# Altium footprint library WR-TBL_Pluggable PCB Header.PcbLib: 719 footprints (part 25 of 45)
Each footprint in its own frame and in the unit in brackets; x right, y up, seen from the top. Pads: shape width x height; smd on the part's side, far side on the other; paste and mask are expansions set on the pad; w line width, h text height; cw(c..) or ccw(c..) is an arc to the next point about the centre after c.
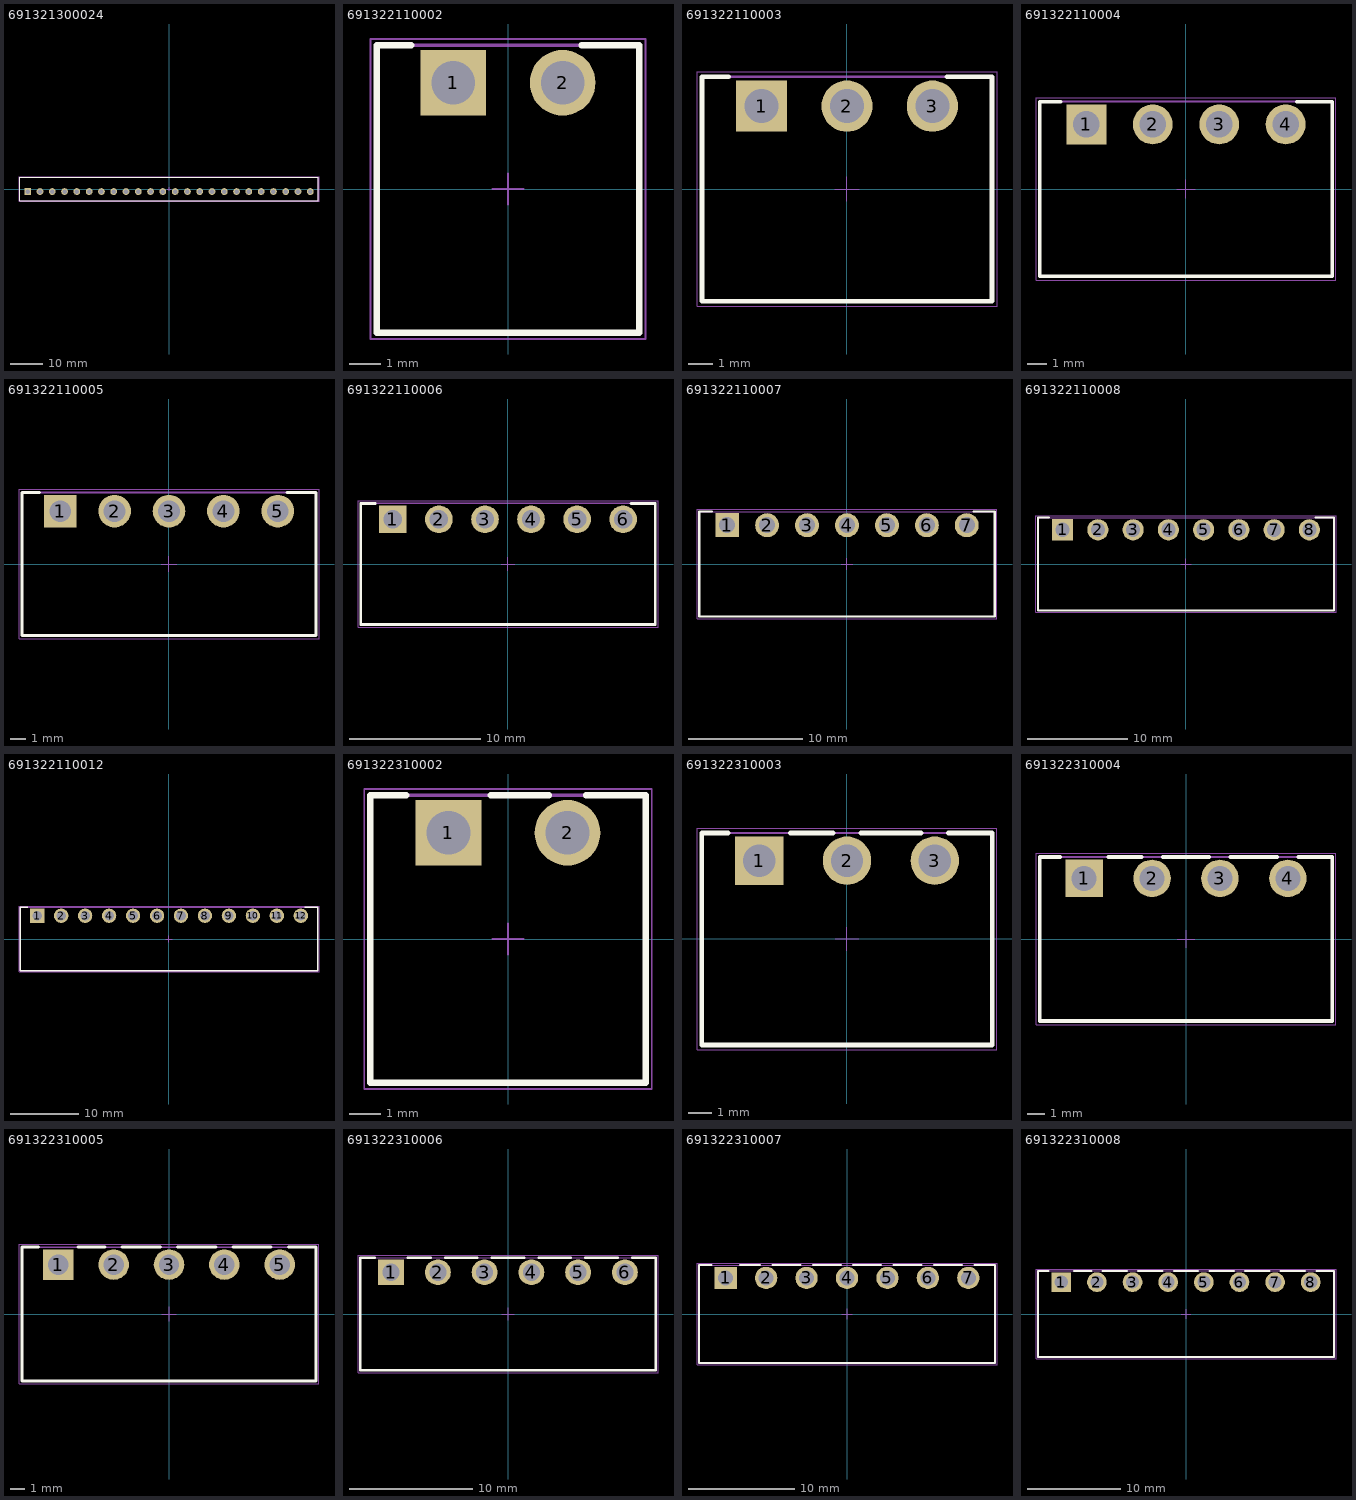
[diagram p24: the footprints below, top view; thin cyan lines are the x and y axes]

## 691321300024 [mm] "Vertical PCB Header, pitch 3.81mm, 24p"
height 9.2
pads (24):
  rect 2.1x2.1 hole 1.4: 1(-43.815,-0.8)
  round 2.1 hole 1.4: 2(-40.005,-0.8) 3(-36.195,-0.8) 4(-32.385,-0.8) 5(-28.575,-0.8) 6(-24.765,-0.8) 7(-20.955,-0.8) 8(-17.145,-0.8) 9(-13.335,-0.8) 10(-9.525,-0.8) 11(-5.715,-0.8) 12(-1.905,-0.8) 13(1.905,-0.8) 14(5.715,-0.8) 15(9.525,-0.8) 16(13.335,-0.8) 17(17.145,-0.8) 18(20.955,-0.8) 19(24.765,-0.8) 20(28.575,-0.8) 21(32.385,-0.8) 22(36.195,-0.8) 23(40.005,-0.8) 24(43.815,-0.8)
Top Overlay:
  lines w0.2: -46.315,-3.6 -46.315,3.6 46.315,3.6 46.315,-3.6 -46.315,-3.6
Mechanical 13:
  lines w0.1: -46.315,-3.6 46.315,-3.6 46.315,3.6 -46.315,3.6 -46.315,-3.6
Mechanical 15:
  lines w0.05: -0.5,0 0.5,0 ; 0,-0.5 0,0.5 ; -46.515,-3.8 46.515,-3.8 46.515,3.8 -46.515,3.8 -46.515,-3.8
3D body "691321300024.stp": height 9.25, standoff -3.45, extent -46.315,-3.6 46.315,3.6

## 691322110002 [mm] "Horizontal PCB Header, pitch 3.5mm, 02p"
height 7
pads (2):
  rect 2.1x2.1 hole 1.4: 1(-1.75,3.4)
  round 2.1 hole 1.4: 2(1.75,3.4)
Top Overlay:
  lines w0.2: -3.1,4.6 -4.2,4.6 -4.2,-4.6 4.2,-4.6 4.2,4.6 2.35,4.6
Mechanical 13:
  lines w0.1: -4.2,-4.6 4.2,-4.6 4.2,4.6 -4.2,4.6 -4.2,-4.6
Mechanical 15:
  lines w0.05: -0.5,0 0.5,0 ; 0,-0.5 0,0.5 ; -4.4,-4.8 4.4,-4.8 4.4,4.8 -4.4,4.8 -4.4,-4.8
3D body "691322110002.stp": height 7.3, standoff -3.4, extent -4.2,-4.6 4.2,4.6

## 691322110003 [mm] "Horizontal PCB Header, pitch 3.5mm, 03p"
height 7
pads (3):
  rect 2.1x2.1 hole 1.4: 1(-3.5,3.4)
  round 2.1 hole 1.4: 2(0,3.4) 3(3.5,3.4)
Top Overlay:
  lines w0.2: -4.85,4.6 -5.95,4.6 -5.95,-4.6 5.95,-4.6 5.95,4.6 4.1,4.6
Mechanical 13:
  lines w0.1: -5.95,-4.6 5.95,-4.6 5.95,4.6 -5.95,4.6 -5.95,-4.6
Mechanical 15:
  lines w0.05: -0.5,0 0.5,0 ; 0,-0.5 0,0.5 ; -6.15,-4.8 6.15,-4.8 6.15,4.8 -6.15,4.8 -6.15,-4.8
3D body "691322110003.stp": height 7.3, standoff -3.4, extent -5.95,-4.6 5.95,4.6

## 691322110004 [mm] "Horizontal PCB Header, pitch 3.5mm, 04p"
height 7
pads (4):
  rect 2.1x2.1 hole 1.4: 1(-5.25,3.4)
  round 2.1 hole 1.4: 2(-1.75,3.4) 3(1.75,3.4) 4(5.25,3.4)
Top Overlay:
  lines w0.2: -6.6,4.6 -7.7,4.6 -7.7,-4.6 7.7,-4.6 7.7,4.6 5.85,4.6
Mechanical 13:
  lines w0.1: -7.7,-4.6 -7.7,4.6 7.7,4.6 7.7,-4.6 -7.7,-4.6
Mechanical 15:
  lines w0.05: -0.5,0 0.5,0 ; 0,-0.5 0,0.5 ; -7.9,-4.8 -7.9,4.8 7.9,4.8 7.9,-4.8 -7.9,-4.8
3D body "691322110004.stp": height 7.3, standoff -3.4, extent -7.7,-4.6 7.7,4.6

## 691322110005 [mm] "Horizontal PCB Header, pitch 3.5mm, 05p"
height 7
pads (5):
  rect 2.1x2.1 hole 1.4: 1(-7,3.4)
  round 2.1 hole 1.4: 2(-3.5,3.4) 3(0,3.4) 4(3.5,3.4) 5(7,3.4)
Top Overlay:
  lines w0.2: -8.35,4.6 -9.45,4.6 -9.45,-4.6 9.45,-4.6 9.45,4.6 7.6,4.6
Mechanical 13:
  lines w0.1: -9.45,-4.6 -9.45,4.6 9.45,4.6 9.45,-4.6 -9.45,-4.6
Mechanical 15:
  lines w0.05: -0.5,0 0.5,0 ; 0,-0.5 0,0.5 ; -9.65,-4.8 -9.65,4.8 9.65,4.8 9.65,-4.8 -9.65,-4.8
3D body "691322110005.stp": height 7.3, standoff -3.4, extent -9.45,-4.6 9.45,4.6

## 691322110006 [mm] "Horizontal PCB Header, pitch 3.5mm, 06p"
height 7
pads (6):
  rect 2.1x2.1 hole 1.4: 1(-8.75,3.4)
  round 2.1 hole 1.4: 2(-5.25,3.4) 3(-1.75,3.4) 4(1.75,3.4) 5(5.25,3.4) 6(8.75,3.4)
Top Overlay:
  lines w0.2: -10.1,4.6 -11.2,4.6 -11.2,-4.6 11.2,-4.6 11.2,4.6 9.35,4.6
Mechanical 13:
  lines w0.1: -11.2,-4.6 -11.2,4.6 11.2,4.6 11.2,-4.6 -11.2,-4.6
Mechanical 15:
  lines w0.05: -0.5,0 0.5,0 ; 0,-0.5 0,0.5 ; -11.4,-4.8 -11.4,4.8 11.4,4.8 11.4,-4.8 -11.4,-4.8
3D body "691322110006.stp": height 7.3, standoff -3.4, extent -11.2,-4.6 11.2,4.6

## 691322110007 [mm] "Horizontal PCB Header, pitch 3.5mm, 07p"
height 7
pads (7):
  rect 2.1x2.1 hole 1.4: 1(-10.5,3.4)
  round 2.1 hole 1.4: 2(-7,3.4) 3(-3.5,3.4) 4(0,3.4) 5(3.5,3.4) 6(7,3.4) 7(10.5,3.4)
Top Overlay:
  lines w0.2: -11.85,4.6 -12.95,4.6 -12.95,-4.6 12.95,-4.6 12.95,4.6 11.1,4.6
Mechanical 13:
  lines w0.1: -12.95,-4.6 -12.95,4.6 12.95,4.6 12.95,-4.6 -12.95,-4.6
Mechanical 15:
  lines w0.05: -0.5,0 0.5,0 ; 0,-0.5 0,0.5 ; -13.15,-4.8 -13.15,4.8 13.15,4.8 13.15,-4.8 -13.15,-4.8
3D body "691322110007.stp": height 7.3, standoff -3.4, extent -12.95,-4.6 12.95,4.6

## 691322110008 [mm] "Horizontal PCB Header, pitch 3.5mm, 08p"
height 7
pads (8):
  rect 2.1x2.1 hole 1.4: 1(-12.25,3.4)
  round 2.1 hole 1.4: 2(-8.75,3.4) 3(-5.25,3.4) 4(-1.75,3.4) 5(1.75,3.4) 6(5.25,3.4) 7(8.75,3.4) 8(12.25,3.4)
Top Overlay:
  lines w0.2: -13.6,4.6 -14.7,4.6 -14.7,-4.6 14.7,-4.6 14.7,4.6 12.85,4.6
Mechanical 13:
  lines w0.1: -14.7,-4.6 14.7,-4.6 14.7,4.6 -14.7,4.6 -14.7,-4.6
Mechanical 15:
  lines w0.05: -0.5,0 0.5,0 ; 0,-0.5 0,0.5 ; -14.9,-4.8 14.9,-4.8 14.9,4.8 -14.9,4.8 -14.9,-4.8
3D body "691322110008.stp": height 7.3, standoff -3.4, extent -14.7,-4.6 14.7,4.6

## 691322110012 [mm] "Horizontal PCB Header, pitch 3.5mm, 12p"
height 7
pads (12):
  rect 2.1x2.1 hole 1.4: 1(-19.25,3.4)
  round 2.1 hole 1.4: 2(-15.75,3.4) 3(-12.25,3.4) 4(-8.75,3.4) 5(-5.25,3.4) 6(-1.75,3.4) 7(1.75,3.4) 8(5.25,3.4) 9(8.75,3.4) 10(12.25,3.4) 11(15.75,3.4) 12(19.25,3.4)
Top Overlay:
  lines w0.2: -20.6,4.6 -21.7,4.6 -21.7,-4.6 21.7,-4.6 21.7,4.6 19.85,4.6
Mechanical 13:
  lines w0.1: -21.7,-4.6 21.7,-4.6 21.7,4.6 -21.7,4.6 -21.7,-4.6
Mechanical 15:
  lines w0.05: -0.5,0 0.5,0 ; 0,-0.5 0,0.5 ; -21.9,-4.8 21.9,-4.8 21.9,4.8 -21.9,4.8 -21.9,-4.8
3D body "691322110012.stp": height 7.3, standoff -3.4, extent -21.7,-4.6 21.7,4.6

## 691322310002 [mm] "Horizontal PCB Header, pitch 3.81mm, 02p"
height 7
pads (2):
  rect 2.1x2.1 hole 1.4: 1(-1.905,3.4)
  round 2.1 hole 1.4: 2(1.905,3.4)
Top Overlay:
  lines w0.2: -3.255,4.6 -4.405,4.6 -4.405,-4.6 4.405,-4.6 4.405,4.6 2.495,4.6 ; -0.555,4.6 1.315,4.6
Mechanical 13:
  lines w0.1: -4.405,-4.6 -4.405,4.6 4.405,4.6 4.405,-4.6 -4.405,-4.6
Mechanical 15:
  lines w0.05: -0.5,0 0.5,0 ; 0,-0.5 0,0.5 ; -4.605,-4.8 -4.605,4.8 4.605,4.8 4.605,-4.8 -4.605,-4.8
3D body "691322310002.stp": height 7.25, standoff -3.45, extent -4.405,-4.6 4.405,4.6

## 691322310003 [mm] "Horizontal PCB Header, pitch 3.81mm, 03p"
height 7
pads (3):
  rect 2.1x2.1 hole 1.4: 1(-3.81,3.4)
  round 2.1 hole 1.4: 2(0,3.4) 3(3.81,3.4)
Top Overlay:
  lines w0.2: -5.16,4.6 -6.31,4.6 -6.31,-4.6 6.31,-4.6 6.31,4.6 4.4,4.6 ; -2.46,4.6 -0.59,4.6 ; 0.59,4.6 3.22,4.6
Mechanical 13:
  lines w0.1: -6.31,-4.6 -6.31,4.6 6.31,4.6 6.31,-4.6 -6.31,-4.6
Mechanical 15:
  lines w0.05: -0.5,0 0.5,0 ; 0,-0.5 0,0.5 ; -6.51,-4.8 -6.51,4.8 6.51,4.8 6.51,-4.8 -6.51,-4.8
3D body "691322310003.stp": height 7.25, standoff -3.45, extent -6.31,-4.6 6.31,4.6

## 691322310004 [mm] "Horizontal PCB Header, pitch 3.81mm, 04p"
height 7
pads (4):
  rect 2.1x2.1 hole 1.4: 1(-5.715,3.4)
  round 2.1 hole 1.4: 2(-1.905,3.4) 3(1.905,3.4) 4(5.715,3.4)
Top Overlay:
  lines w0.2: -7.065,4.6 -8.215,4.6 -8.215,-4.6 8.215,-4.6 8.215,4.6 6.305,4.6 ; -4.365,4.6 -2.495,4.6 ; -1.315,4.6 1.315,4.6 ; 2.495,4.6 5.125,4.6
Mechanical 13:
  lines w0.1: -8.215,-4.6 -8.215,4.6 8.215,4.6 8.215,-4.6 -8.215,-4.6
Mechanical 15:
  lines w0.05: -0.5,0 0.5,0 ; 0,-0.5 0,0.5 ; -8.415,-4.8 -8.415,4.8 8.415,4.8 8.415,-4.8 -8.415,-4.8
3D body "691322310004.stp": height 7.25, standoff -3.45, extent -8.215,-4.6 8.215,4.6

## 691322310005 [mm] "Horizontal PCB Header, pitch 3.81mm, 05p"
height 7
pads (5):
  rect 2.1x2.1 hole 1.4: 1(-7.62,3.4)
  round 2.1 hole 1.4: 2(-3.81,3.4) 3(0,3.4) 4(3.81,3.4) 5(7.62,3.4)
Top Overlay:
  lines w0.2: -8.97,4.6 -10.12,4.6 -10.12,-4.6 10.12,-4.6 10.12,4.6 8.21,4.6 ; -6.27,4.6 -4.4,4.6 ; -3.22,4.6 -0.59,4.6 ; 0.59,4.6 3.22,4.6 ; 4.4,4.6 7.03,4.6
Mechanical 13:
  lines w0.1: -10.12,-4.6 10.12,-4.6 10.12,4.6 -10.12,4.6 -10.12,-4.6
Mechanical 15:
  lines w0.05: -0.5,0 0.5,0 ; 0,-0.5 0,0.5 ; -10.32,-4.8 10.32,-4.8 10.32,4.8 -10.32,4.8 -10.32,-4.8
3D body "691322310005.stp": height 7.25, standoff -3.45, extent -10.12,-4.6 10.12,4.6

## 691322310006 [mm] "Horizontal PCB Header, pitch 3.81mm, 06p"
height 7
pads (6):
  rect 2.1x2.1 hole 1.4: 1(-9.525,3.4)
  round 2.1 hole 1.4: 2(-5.715,3.4) 3(-1.905,3.4) 4(1.905,3.4) 5(5.715,3.4) 6(9.525,3.4)
Top Overlay:
  lines w0.2: -10.875,4.6 -12.025,4.6 -12.025,-4.6 12.025,-4.6 12.025,4.6 10.115,4.6 ; -8.175,4.6 -6.305,4.6 ; -5.125,4.6 -2.495,4.6 ; -1.315,4.6 1.315,4.6 ; 2.495,4.6 5.125,4.6 ; 6.305,4.6 8.935,4.6
Mechanical 13:
  lines w0.1: -12.025,-4.6 -12.025,4.6 12.025,4.6 12.025,-4.6 -12.025,-4.6
Mechanical 15:
  lines w0.05: -0.5,0 0.5,0 ; 0,-0.5 0,0.5 ; -12.225,-4.8 -12.225,4.8 12.225,4.8 12.225,-4.8 -12.225,-4.8
3D body "691322310006.stp": height 7.25, standoff -3.45, extent -12.025,-4.6 12.025,4.6

## 691322310007 [mm] "Horizontal PCB Header, pitch 3.81mm, 07p"
height 7
pads (7):
  rect 2.1x2.1 hole 1.4: 1(-11.43,3.4)
  round 2.1 hole 1.4: 2(-7.62,3.4) 3(-3.81,3.4) 4(0,3.4) 5(3.81,3.4) 6(7.62,3.4) 7(11.43,3.4)
Top Overlay:
  lines w0.2: -12.78,4.6 -13.93,4.6 -13.93,-4.6 13.93,-4.6 13.93,4.6 12.02,4.6 ; -10.08,4.6 -8.21,4.6 ; -7.03,4.6 -4.4,4.6 ; -3.22,4.6 -0.59,4.6 ; 0.59,4.6 3.22,4.6 ; 4.4,4.6 7.03,4.6 ; 8.21,4.6 10.84,4.6
Mechanical 13:
  lines w0.1: -13.93,-4.6 -13.93,4.6 13.93,4.6 13.93,-4.6 -13.93,-4.6
Mechanical 15:
  lines w0.05: -0.5,0 0.5,0 ; 0,-0.5 0,0.5 ; -14.13,-4.8 -14.13,4.8 14.13,4.8 14.13,-4.8 -14.13,-4.8
3D body "691322310007.stp": height 7.25, standoff -3.45, extent -13.93,-4.6 13.93,4.6

## 691322310008 [mm] "Horizontal PCB Header, pitch 3.81mm, 08p"
height 7
pads (8):
  rect 2.1x2.1 hole 1.4: 1(-13.335,3.4)
  round 2.1 hole 1.4: 2(-9.525,3.4) 3(-5.715,3.4) 4(-1.905,3.4) 5(1.905,3.4) 6(5.715,3.4) 7(9.525,3.4) 8(13.335,3.4)
Top Overlay:
  lines w0.2: -14.685,4.6 -15.835,4.6 -15.835,-4.6 15.835,-4.6 15.835,4.6 13.925,4.6 ; -11.985,4.6 -10.115,4.6 ; -8.935,4.6 -6.305,4.6 ; -5.125,4.6 -2.495,4.6 ; -1.315,4.6 1.315,4.6 ; 2.495,4.6 5.125,4.6 ; 6.305,4.6 8.935,4.6 ; 10.115,4.6 12.745,4.6
Mechanical 13:
  lines w0.1: -15.835,-4.6 -15.835,4.6 15.835,4.6 15.835,-4.6 -15.835,-4.6
Mechanical 15:
  lines w0.05: -0.5,0 0.5,0 ; 0,-0.5 0,0.5 ; -16.035,-4.8 -16.035,4.8 16.035,4.8 16.035,-4.8 -16.035,-4.8
3D body "691322310008.stp": height 7.25, standoff -3.45, extent -15.835,-4.6 15.835,4.6